# Altium footprint library chipfc_libs.PCBLIB: 283 footprints (part 9 of 18)
Each footprint in its own frame and in the unit in brackets; x right, y up, seen from the top. Pads: shape width x height; smd on the part's side, far side on the other; paste and mask are expansions set on the pad; w line width, h text height; cw(c..) or ccw(c..) is an arc to the next point about the centre after c.
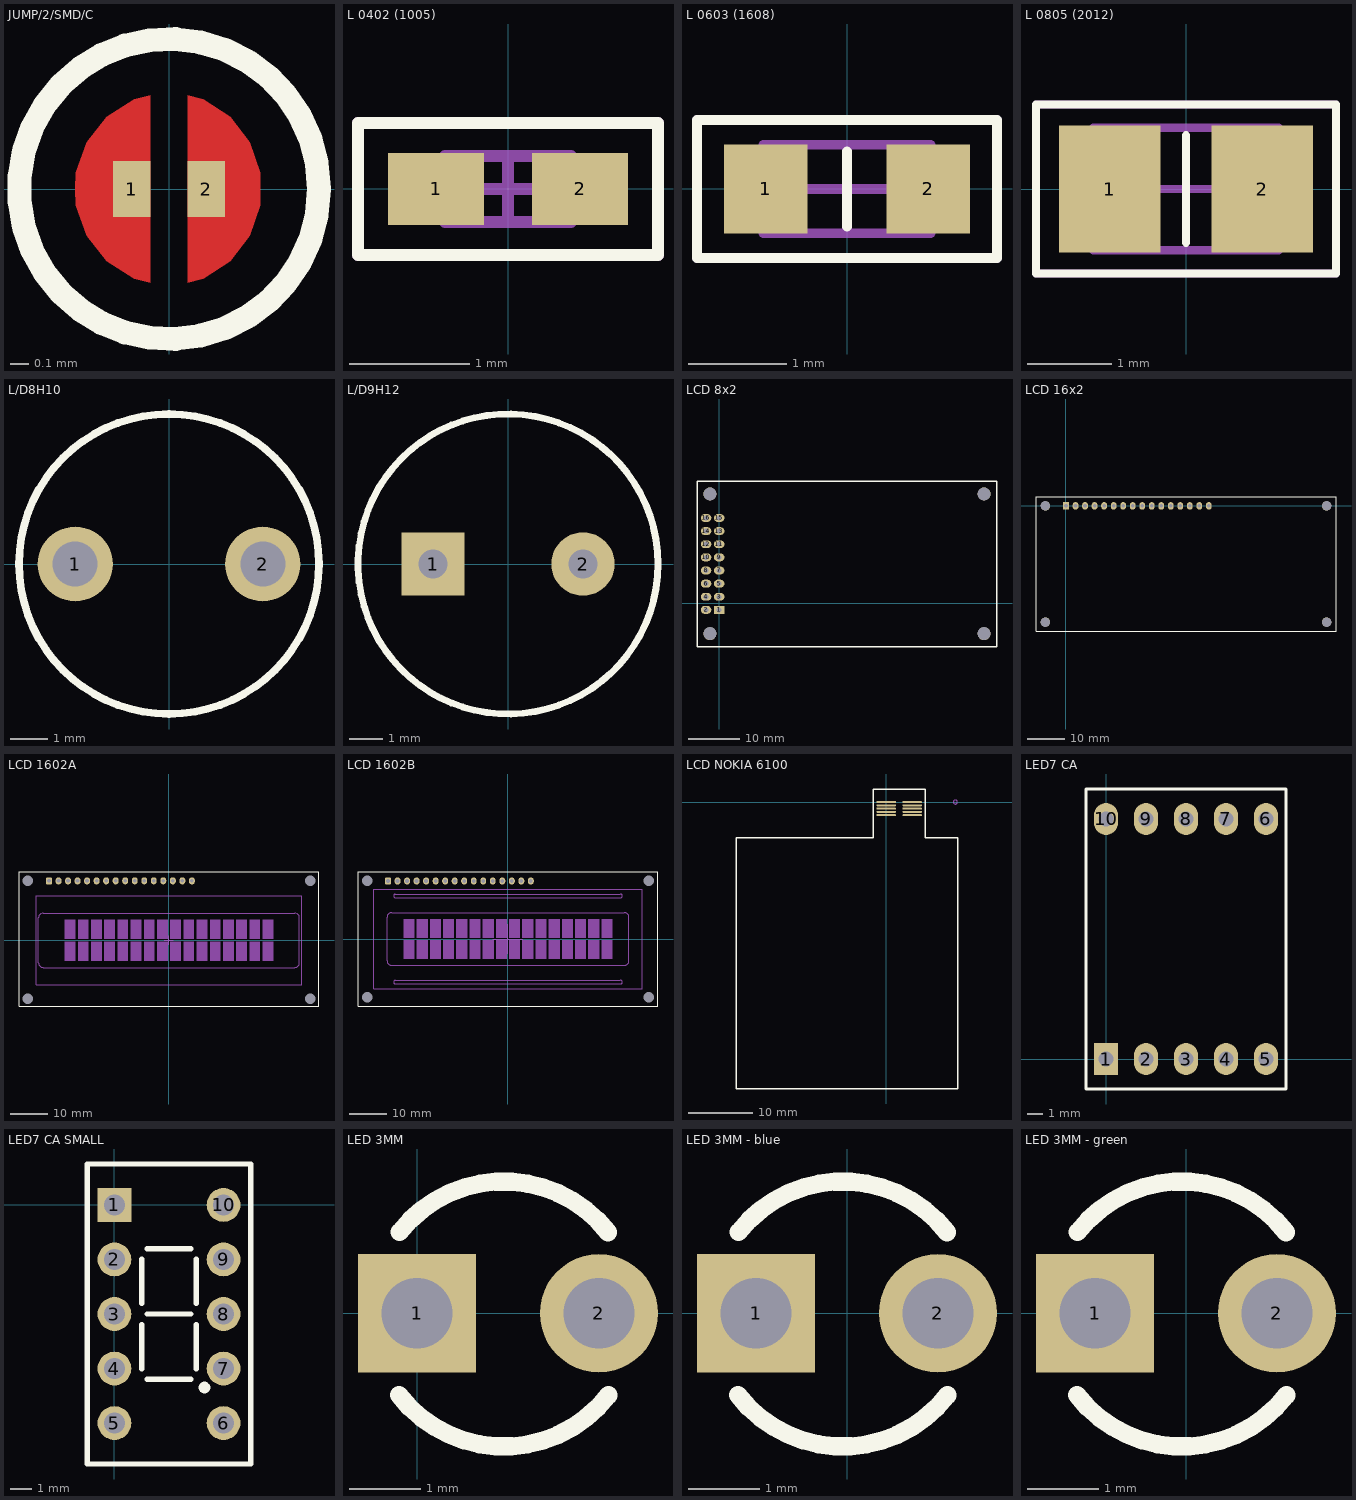
[diagram p8: the footprints below, top view; thin cyan lines are the x and y axes]

## JUMP/2/SMD/C [mm] "Chip Resistor, 2-Leads, Body 1.6x0.8mm, IPC Medium Density"
height 0.55
pads (2):
  rect 0.2x0.3 smd: 1(-0.2,0) 2(0.2,0)
Top Layer:
  region: -0.1,0.5 -0.1,-0.5 -0.185,-0.48 -0.331,-0.386 -0.44,-0.251 -0.499,-0.087 -0.5,0 -0.499,0.087 -0.44,0.251 -0.331,0.386 -0.185,0.48
  region: 0.1,-0.5 0.1,0.5 0.183,0.478 0.327,0.384 0.432,0.248 0.487,0.086 0.487,0 0.487,-0.086 0.432,-0.248 0.327,-0.384 0.183,-0.478
Top Overlay:
  circle w0.127: c0,0 r0.8
Top Solder:
  region: 0,-0.6 -0.119,-0.6 -0.34,-0.509 -0.509,-0.34 -0.6,-0.119 -0.6,0 -0.6,0.119 -0.509,0.34 -0.34,0.509 -0.119,0.6 0,0.6
  region: 0,0.6 0.119,0.6 0.34,0.509 0.509,0.34 0.6,0.119 0.6,0 0.6,-0.119 0.509,-0.34 0.34,-0.509 0.119,-0.6 0,-0.6

## L 0402 (1005) [mm] "Chip Capacitor, 2-Leads, Body 1.0x0.5mm, IPC Medium Density"
height 0.55
pads (2):
  rect 0.8x0.6 smd: 1(-0.6,0) 2(0.6,0)
Top Overlay:
  lines w0.1: -1.25,-0.55 1.25,-0.55 1.25,0.55 -1.25,0.55 -1.25,-0.55
Mechanical 13:
  lines w0.1: -0.525,-0.275 0.525,-0.275 0.525,0.275 -0.525,0.275 -0.525,-0.275
Mechanical 15:
  lines w0.1: -0.275,0 0.275,0 ; 0,-0.275 0,0.275 ; -1.25,-0.55 1.25,-0.55 1.25,0.55 -1.25,0.55 -1.25,-0.55
3D body "User Library-Chip Inductor-L0402 (1005).step": height 0.5, standoff 0, extent -0.5,-0.3 0.5,0.3

## L 0603 (1608) [mm] "Chip Capacitor, 2-Leads, Body 1.6x0.8mm, IPC Medium Density"
height 0.8
pads (2):
  rect 0.85x0.9 smd: 1(-0.825,0) 2(0.825,0)
Top Overlay:
  lines w0.1: 0,-0.381 0,0.381 ; -1.525,-0.7 -1.525,0.7 1.525,0.7 1.525,-0.7 -1.525,-0.7
Mechanical 13:
  lines w0.1: -0.85,-0.45 -0.85,0.45 0.85,0.45 0.85,-0.45 -0.85,-0.45
Mechanical 15:
  lines w0.1: -0.45,0 0.45,0 ; 0,-0.45 0,0.45 ; -1.525,-0.7 -1.525,0.7 1.525,0.7 1.525,-0.7 -1.525,-0.7
3D body "User Library-Chip Inductor-L0603 (1608).step": height 0.8, standoff 0, extent -0.8,-0.475 0.8,0.475

## L 0805 (2012) [mm] "Chip Capacitor, 2-Leads, Body 2.0x1.3mm, IPC Medium Density"
height 0.85
pads (2):
  rect 1.2x1.5 smd: 1(-0.9,0) 2(0.9,0)
Top Overlay:
  lines w0.1: 0,-0.635 0,0.635 ; -1.775,-1 -1.775,1 1.775,1 1.775,-1 -1.775,-1
Mechanical 13:
  lines w0.1: -1.1,-0.725 -1.1,0.725 1.1,0.725 1.1,-0.725 -1.1,-0.725
Mechanical 15:
  lines w0.1: -0.5,0 0.5,0 ; 0,-0.5 0,0.5 ; -1.775,-1 1.775,-1 1.775,1 -1.775,1 -1.775,-1
3D body "User Library-Chip Inductor-L0805 (2012).step": height 0.95, standoff 0, extent -1,-0.6 1,0.6

## L/D8H10 [mm] "inductor Dia (7.80mm) Heigh (10.00mm)"
pads (2):
  round 2 hole 1.2: 1(-2.5,0) 2(2.5,0)
Top Overlay:
  circle w0.203: c0,0 r4
3D body "STEP-WE-TI-HV-8095-rev1.stp": height 9.5, standoff -5, extent -5.515,-5.516 5.516,5.515

## L/D9H12 [mm] "inductor"
pads (2):
  rect 1.905x1.905 hole 0.864: 1(-2.25,0)
  round 1.905 hole 0.864: 2(2.25,0)
Top Overlay:
  circle w0.203: c0,0 r4.5
3D body "User Library-Inductor 10x12 (200 mils).STEP": height 12.13, standoff -3.87, extent -5,-5.115 5,4.885

## LCD 8x2 [mil]
pads (20):
  rect 80x60 / inner round 60 / far side rect 80x60 hole 38: 1(0,-50)
  oval 80x60 / inner round 60 / far side oval 80x60 hole 38: 2(-100,-50) 3(0,50) 4(-100,50) 5(0,150) 6(-100,150) 7(0,250) 8(-100,250) 9(0,350) 10(-100,350) 11(0,450) 12(-100,450) 13(0,550) 14(-100,550) 15(0,650) 16(-100,650)
  round 98.43 hole 98.43: HOLE(-70.47,832.28) HOLF(2016.14,832.28) HOLG(2016.14,-230.71) HOLH(-70.47,-230.71)
Top Overlay:
  lines w10: -168.9,-329.13 2114.57,-329.13 2114.57,927.95 -168.9,927.95 -168.9,-329.13

## LCD 16x2 [mil]
pads (20):
  rect 60x80 / inner round 60 / far side rect 60x80 hole 38: 1(0,0)
  oval 60x80 / inner round 60 / far side oval 60x80 hole 38: 2(100,0) 3(200,0) 4(300,0) 5(400,0) 6(500,0) 7(600,0) 8(700,0) 9(800,0) 10(900,0) 11(1000,0) 12(1100,0) 13(1200,0) 14(1300,0) 15(1400,0) 16(1500,0)
  round 98.43 hole 98.43: HOLE(-216.54,0) HOLF(2736.22,0) HOLG(2736.22,-1220.47) HOLH(-216.54,-1220.47)
Top Overlay:
  lines w10: -314.96,-1318.9 2834.65,-1318.9 2834.65,98.43 -314.96,98.43 -314.96,-1318.9
3D body "User Library-AC162B.step": height 433.07, standoff -114.17, extent -314.96,-1318.9 2834.65,98.43

## LCD 1602A [mm]
pads (20):
  rrect50% 1.575x1.905 hole 0.991: 1(-32,15.85)
  oval 1.575x1.905 hole 0.991: 2(-29.46,15.85) 3(-26.92,15.85) 4(-24.38,15.85) 5(-21.84,15.85) 6(-19.3,15.85) 7(-16.76,15.85) 8(-14.22,15.85) 9(-11.68,15.85) 10(-9.14,15.85) 11(-6.6,15.85) 12(-4.06,15.85) 13(-1.52,15.85) 14(1.02,15.85) 15(3.56,15.85) 16(6.1,15.85)
  round 0 hole 2.8: HOLE(-37.7,15.85) HOLF(37.7,15.85) HOLG(37.7,-15.55) HOLH(-37.7,-15.55)
Top Overlay:
  lines w0.254: -40,-17.65 -40,18.35 40,18.35 40,-17.65 -40,-17.65
Mechanical 13:
  rectangle: 24.95,0.35 27.85,5.5
  rectangle: 24.95,-5.5 27.85,-0.35
  rectangle: 21.43,0.35 24.33,5.5
  rectangle: 21.43,-5.5 24.33,-0.35
  rectangle: 17.91,0.35 20.81,5.5
  rectangle: 17.91,-5.5 20.81,-0.35
  rectangle: 14.39,0.35 17.29,5.5
  rectangle: 14.39,-5.5 17.29,-0.35
  rectangle: 10.87,0.35 13.77,5.5
  rectangle: 10.87,-5.5 13.77,-0.35
  rectangle: 7.35,0.35 10.25,5.5
  rectangle: 7.35,-5.5 10.25,-0.35
  rectangle: 3.83,0.35 6.73,5.5
  rectangle: 3.83,-5.5 6.73,-0.35
  rectangle: 0.31,0.35 3.21,5.5
  rectangle: 0.31,-5.5 3.21,-0.35
  rectangle: -3.21,0.35 -0.31,5.5
  rectangle: -3.21,-5.5 -0.31,-0.35
  rectangle: -6.73,0.35 -3.83,5.5
  rectangle: -6.73,-5.5 -3.83,-0.35
  rectangle: -10.25,0.35 -7.35,5.5
  rectangle: -10.25,-5.5 -7.35,-0.35
  rectangle: -13.77,0.35 -10.87,5.5
  rectangle: -13.77,-5.5 -10.87,-0.35
  rectangle: -17.29,0.35 -14.39,5.5
  rectangle: -17.29,-5.5 -14.39,-0.35
  rectangle: -20.81,0.35 -17.91,5.5
  rectangle: -20.81,-5.5 -17.91,-0.35
  rectangle: -24.33,0.35 -21.43,5.5
  rectangle: -24.33,-5.5 -21.43,-0.35
  rectangle: -27.85,-5.5 -24.95,-0.35
  rectangle: -27.85,0.35 -24.95,5.5
  lines w0.203: -1.2,0 1.2,0 ; 0,-1.2 0,1.2 ; -35.4,-11.9 35.4,-11.9 35.4,11.9 -35.4,11.9 -35.4,-11.9 ; -34.8,-5.95 ccw(c-33.5,-5.95) -33.5,-7.25 33.5,-7.25 ccw(c33.5,-5.95) 34.8,-5.95 34.8,5.95 ccw(c33.5,5.95) 33.5,7.25 -33.5,7.25 ccw(c-33.5,5.95) -34.8,5.95 -34.8,-5.95
3D body "User Library-AC162B.step": height 11, standoff -2.9, extent -40,-17.65 40,18.35

## LCD 1602B [mm]
pads (20):
  rrect50% 1.575x1.905 hole 0.991: 1(-32,15.46)
  oval 1.575x1.905 hole 0.991: 2(-29.46,15.46) 3(-26.92,15.46) 4(-24.38,15.46) 5(-21.84,15.46) 6(-19.3,15.46) 7(-16.76,15.46) 8(-14.22,15.46) 9(-11.68,15.46) 10(-9.14,15.46) 11(-6.6,15.46) 12(-4.06,15.46) 13(-1.52,15.46) 14(1.02,15.46) 15(3.56,15.46) 16(6.1,15.46)
  round 0 hole 2.8: HOLE(-37.55,15.5) HOLF(37.55,15.5) HOLG(37.55,-15.5) HOLH(-37.55,-15.5)
Top Overlay:
  lines w0.254: -40,-18 40,-18 40,18 -40,18 -40,-18
Mechanical 1:
  lines w0.203: -4,0 4,0 ; 0,-4 0,4
Mechanical 13:
  rectangle: -27.9,0.3 -24.9,5.32
  rectangle: -27.9,-5.32 -24.9,-0.3
  rectangle: -24.38,-5.32 -21.38,-0.3
  rectangle: -24.38,0.3 -21.38,5.32
  rectangle: -20.86,-5.32 -17.86,-0.3
  rectangle: -20.86,0.3 -17.86,5.32
  rectangle: -17.34,-5.32 -14.34,-0.3
  rectangle: -17.34,0.3 -14.34,5.32
  rectangle: -13.82,-5.32 -10.82,-0.3
  rectangle: -13.82,0.3 -10.82,5.32
  rectangle: -10.3,-5.32 -7.3,-0.3
  rectangle: -10.3,0.3 -7.3,5.32
  rectangle: -6.78,-5.32 -3.78,-0.3
  rectangle: -6.78,0.3 -3.78,5.32
  rectangle: -3.26,-5.32 -0.26,-0.3
  rectangle: -3.26,0.3 -0.26,5.32
  rectangle: 0.26,-5.32 3.26,-0.3
  rectangle: 0.26,0.3 3.26,5.32
  rectangle: 3.78,-5.32 6.78,-0.3
  rectangle: 3.78,0.3 6.78,5.32
  rectangle: 7.3,-5.32 10.3,-0.3
  rectangle: 7.3,0.3 10.3,5.32
  rectangle: 10.82,-5.32 13.82,-0.3
  rectangle: 10.82,0.3 13.82,5.32
  rectangle: 14.34,-5.32 17.34,-0.3
  rectangle: 14.34,0.3 17.34,5.32
  rectangle: 17.86,-5.32 20.86,-0.3
  rectangle: 17.86,0.3 20.86,5.32
  rectangle: 21.38,-5.32 24.38,-0.3
  rectangle: 21.38,0.3 24.38,5.32
  rectangle: 24.9,-5.32 27.9,-0.3
  rectangle: 24.9,0.3 27.9,5.32
  lines w0.203: -35.75,-13.25 35.75,-13.25 35.75,13.25 -35.75,13.25 -35.75,-13.25 ; -32.25,-5.75 ccw(c-31,-5.75) -31,-7 31,-7 ccw(c31,-5.75) 32.25,-5.75 32.25,5.75 ccw(c31,5.75) 31,7 -31,7 ccw(c-31,5.75) -32.25,5.75 -32.25,-5.75 ; -30,-12 cw(c-30,-11.5) -30,-11 30,-11 cw(c30,-11.5) 30,-12 -30,-12 ; -30,11 cw(c-30,11.5) -30,12 30,12 cw(c30,11.5) 30,11 -30,11
3D body "User Library-AC162B.step": height 11, standoff -2.9, extent -40,-18 40,18

## LCD NOKIA 6100 [mil]
pads (10):
  rect 120x12 smd: 1(0,0)
  oval 120x12 smd: 2(0,-20) 3(0,-40) 4(0,-60) 5(0,-80) 6(160,-80) 7(160,-60) 8(160,-40) 9(160,-20) 10(160,0)
Top Overlay:
  lines w8: -920,-1760 440,-1760 440,-220 240,-220 240,80 -80,80 -80,-220 -920,-220 -920,-1760
Mechanical 3:
  lines w4: 412.5,0 cw(c425,0) 425,12.5 cw(c425,0) 437.5,0 cw(c425,0) 425,-12.5 cw(c425,0) 412.5,0

## LED7 CA [mil]
pads (10):
  rect 60x80 hole 38: 1(0,0)
  oval 60x80 hole 38: 2(100,0) 3(200,0) 4(300,0) 5(400,0) 6(400,600) 7(300,600) 8(200,600) 9(100,600) 10(0,600)
Top Overlay:
  lines w7.87: -50,-75 450,-75 450,675 -50,675 -50,-75
3D body "SW3dPS-Disp_SA56-11.STEP": height 316.25, standoff -156.19, extent -50,-75 450,675

## LED7 CA SMALL [mil]
pads (10):
  rect 62x62 hole 38: 1(0,0)
  round 62 hole 38: 2(0,-100) 3(0,-200) 4(0,-300) 5(0,-400) 6(200,-400) 7(200,-300) 8(200,-200) 9(200,-100) 10(200,0)
Top Overlay:
  region: 167.07,-324.59 170.9,-326.17 172.36,-327.64 173.83,-329.1 175.41,-332.93 175.41,-334.01 175.82,-335 175.77,-335.14 175.78,-335.19 175.41,-336.04 175.41,-337.07 175.37,-337.11 175.37,-337.16 173.83,-340.9 171.87,-342.85 170.9,-343.83 167.07,-345.41 162.93,-345.41 159.1,-343.83 157.64,-342.36 156.17,-340.9 154.59,-337.07 154.59,-332.93 156.17,-329.1 157.64,-327.64 159.1,-326.17 162.93,-324.59
  lines w10: 50,-300 50,-220 ; 50,-180 50,-100 ; 60,-320 140,-320 ; 60,-200 140,-200 ; 60,-80 140,-80 ; 150,-300 150,-220 ; 150,-180 150,-100 ; -50,-475 -50,75 250,75 250,-475 -50,-475
3D body "User Library-AFF7.step": height 200.79, standoff -236.22, extent -50,-448.03 243.31,48.03

## LED 3MM [mil]
pads (2):
  rect 65x65 hole 39: 1(0,0)
  round 65 hole 39: 2(100,0)
Top Overlay:
  lines w10: -10.03,-45.02 ccw(c47.63,-0.43) 105.19,-45.15 ; -9.61,44.69 cw(c47.63,-0.43) 105,44.52
3D body "User Library-LED D3mm GREEN.STEP": height 207.04, standoff -107.93, extent -15.51,-64.9 114.41,64.57

## LED 3MM - blue [mil]
pads (2):
  rect 65x65 hole 39: 1(-50,0)
  round 65 hole 39: 2(50,0)
Top Overlay:
  lines w10: -60.03,-45.02 ccw(c-2.37,-0.43) 55.19,-45.15 ; -59.61,44.69 cw(c-2.37,-0.43) 55,44.52
3D body "User Library-LED_d3-BLU.STEP": height 195.87, standoff -98.43, extent -65.51,-65.07 61.01,64.74

## LED 3MM - green [mil]
pads (2):
  rect 65x65 hole 39: 1(-50,0)
  round 65 hole 39: 2(50,0)
Top Overlay:
  lines w10: -60.03,-45.02 ccw(c-2.37,-0.43) 55.19,-45.15 ; -59.61,44.69 cw(c-2.37,-0.43) 55,44.52
3D body "User Library-LED D3mm GREEN.STEP": height 207.04, standoff -107.93, extent -65.51,-64.9 64.41,64.57